# Altium footprint library PcbLib1.PcbLib: 102 footprints (part 4 of 7)
Each footprint in its own frame and in the unit in brackets; x right, y up, seen from the top. Pads: shape width x height; smd on the part's side, far side on the other; paste and mask are expansions set on the pad; w line width, h text height; cw(c..) or ccw(c..) is an arc to the next point about the centre after c.
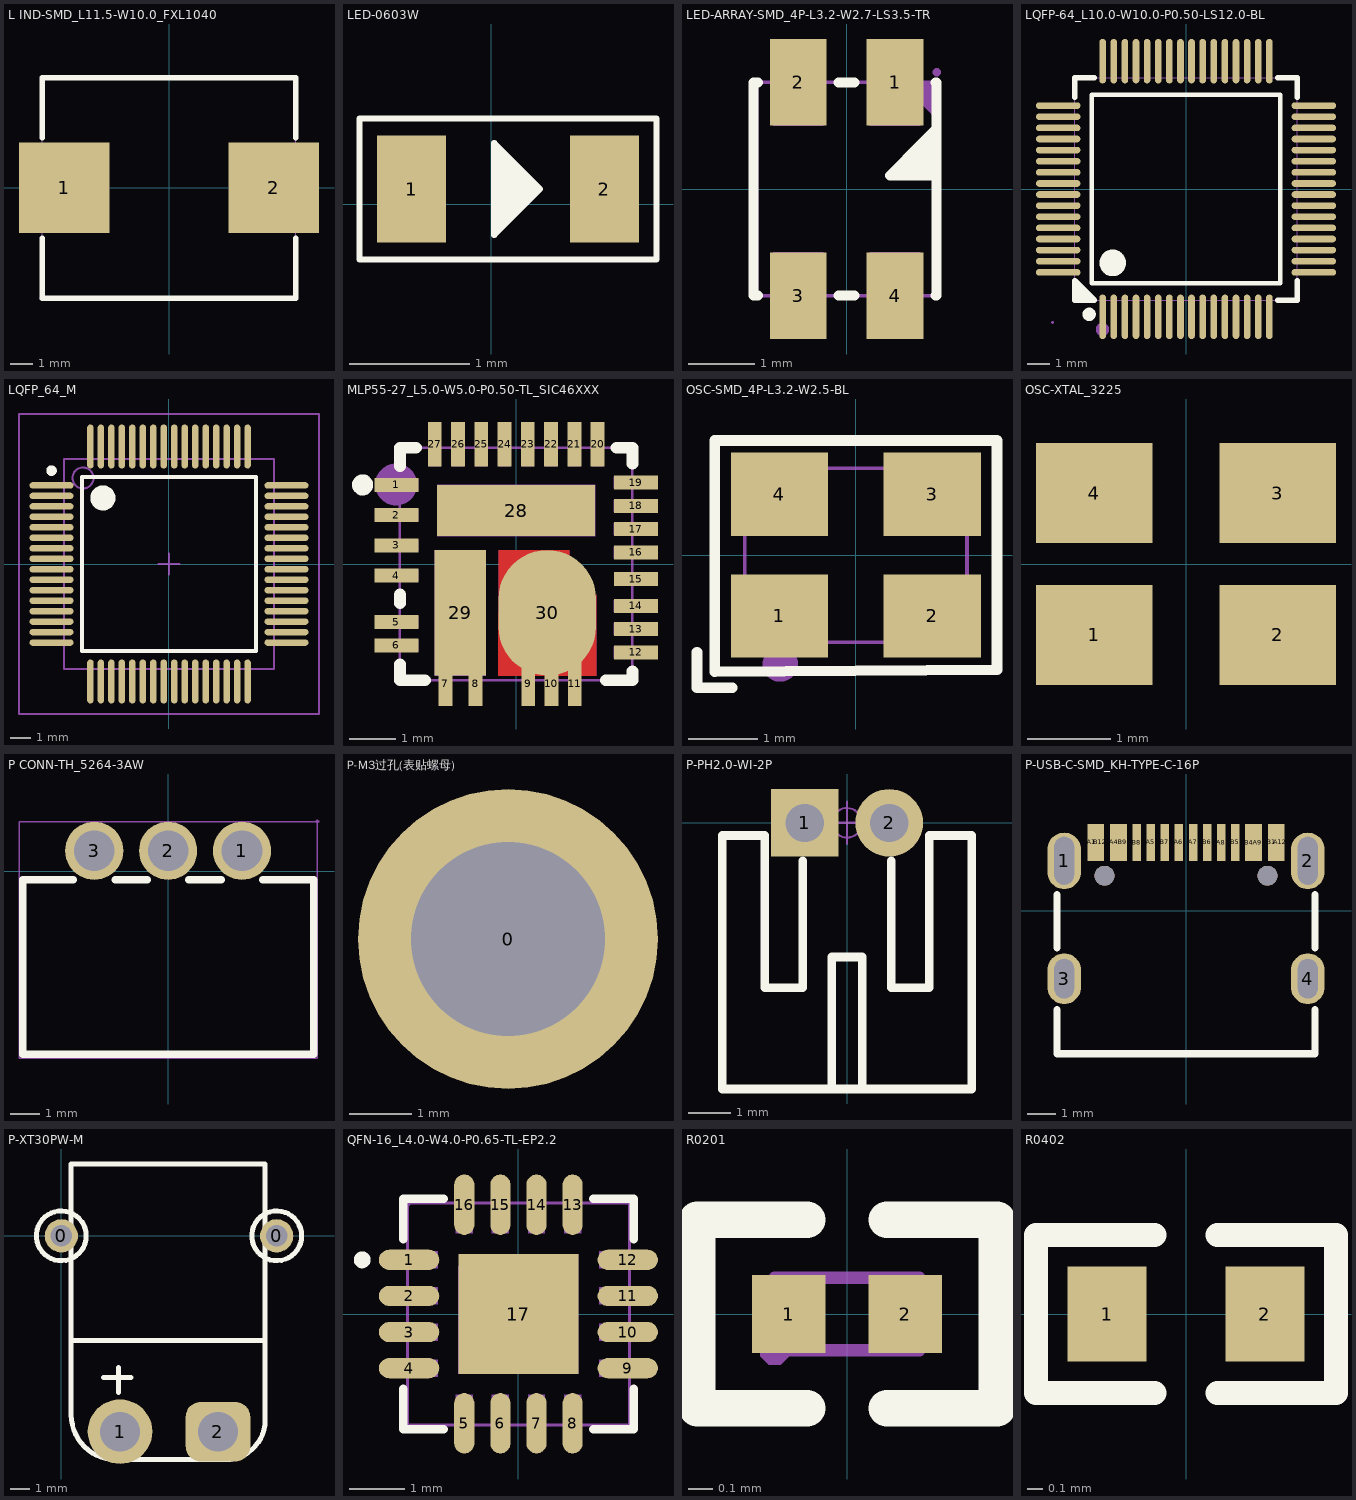
[diagram p3: the footprints below, top view; thin cyan lines are the x and y axes]

## L IND-SMD_L11.5-W10.0_FXL1040 [mm]
pads (2):
  rect 4.1x4.1 smd mask+0.051: 1(-4.75,0) 2(4.75,0)
Top Overlay:
  lines w0.254: -5.75,-2.281 -5.75,-5 5.75,-5 5.75,-2.281 ; -5.75,2.281 -5.75,5 5.75,5 5.75,2.281
Mechanical 15:
  region: -5.65,-5 -5.65,-4.959 -5.709,-4.9 -5.791,-4.9 -5.85,-4.959 -5.85,-5 -5.85,-5.041 -5.791,-5.1 -5.709,-5.1 -5.65,-5.041 -5.65,-5
  region: -5.75,-1.5 -5.75,1.5 -3.75,1.5 -3.75,-1.5
  region: 3.75,-1.5 3.75,1.5 5.75,1.5 5.75,-1.5
  lines w0.051: -5.75,-5 5.75,-5 5.75,5 -5.75,5 -5.75,-5

## LED-0603W [mil]
pads (2):
  rect 22.44x35 smd: 1(-26,5) 2(37,5)
Top Overlay:
  lines w2: 2,17 2,-7 3,-7 3,17 4,16 4,-5 5,-4 5,14 6,13 6,-4 8,-2 8,12 7,13 7,-2 9,0 9,11 10,10 10,1 12,3 ; 6,3 8,5 10,7 12,7 ; 12,3 12,6 12,5 15,5 14,6 13,5 13,3 13,6 12,7 ; 12,3 11,2 11,8 12,7 ; 12,3 12,7 ; -43,-18 54,-18 54,28 -43,28 -43,-18 ; 1,-10 1,20 16,5 1,-10
3D body "15.STEP": height 23.82, standoff -0.04, extent -25.5,-10 37.5,21.58

## LED-ARRAY-SMD_4P-L3.2-W2.7-LS3.5-TR [mm]
pads (4):
  rect 0.85x1.3 smd mask+0.05: 1(0.725,1.6) 2(-0.725,1.6) 3(-0.725,-1.6) 4(0.725,-1.6)
Top Overlay:
  region: 1.341,0.903 1.341,0.203 0.641,0.203
  lines w0.152: -1.33,-1.6 -1.4,-1.6 -1.4,1.6 -1.33,1.6 ; -0.12,-1.6 0.12,-1.6 ; -0.12,1.6 0.12,1.6 ; 1.33,-1.6 1.35,-1.6 1.35,1.6 1.33,1.6 ; 1.35,0.2 0.65,0.2 0.65,0.204 1.131,0.684 1.342,0.896 1.35,0.896
Mechanical 6:
  region: 1.075,-1.45 0.425,-1.45 0.425,-1.35 1.075,-1.35
  region: 0.7,-1.725 0.7,-1.075 0.8,-1.075 0.8,-1.725
  region: -0.85,0.975 -0.85,1.625 -0.75,1.625 -0.75,0.975
  region: -0.8,-1.625 -0.8,-0.975 -0.7,-0.975 -0.7,-1.625
  region: 0.5,1 0.5,1.65 0.6,1.65 0.6,1
  region: 1.35,1.6 0.8,1.6 1.35,1.05
Mechanical 15:
  region: -1.1,-1.75 -1.1,-0.95 -0.35,-0.95 -0.35,-1.75
  region: -1.1,0.95 -1.1,1.75 -0.35,1.75 -0.35,0.95
  region: 0.35,0.95 0.35,1.75 1.1,1.75 1.1,0.95
  region: 0.35,-1.75 0.35,-0.95 1.1,-0.95 1.1,-1.75
  region: 1.41,1.75 1.41,1.775 1.375,1.81 1.325,1.81 1.29,1.775 1.29,1.75 1.29,1.725 1.325,1.69 1.375,1.69 1.41,1.725 1.41,1.75
  lines w0.051: -1.35,-1.6 -1.35,1.6 1.35,1.6 1.35,-1.6 -1.35,-1.6
3D body "CASE-B-3528.STEP": height 1.97, standoff -0.03, extent -1.4,-1.85 1.4,1.85

## LQFP-64_L10.0-W10.0-P0.50-LS12.0-BL [mm]
pads (64):
  oval 0.3x2 smd: 1(-3.75,-5.75) 2(-3.25,-5.75) 3(-2.75,-5.75) 4(-2.25,-5.75) 5(-1.75,-5.75) 6(-1.25,-5.75) 7(-0.75,-5.75) 8(-0.25,-5.75) 9(0.25,-5.75) 10(0.75,-5.75) 11(1.25,-5.75) 12(1.75,-5.75) 13(2.25,-5.75) 14(2.75,-5.75) 15(3.25,-5.75) 16(3.75,-5.75) 33(3.75,5.75) 34(3.25,5.75) 35(2.75,5.75) 36(2.25,5.75) 37(1.75,5.75) 38(1.25,5.75) 39(0.75,5.75) 40(0.25,5.75) 41(-0.25,5.75) 42(-0.75,5.75) 43(-1.25,5.75) 44(-1.75,5.75) 45(-2.25,5.75) 46(-2.75,5.75) 47(-3.25,5.75) 48(-3.75,5.75)
  oval 2x0.3 smd: 17(5.75,-3.75) 18(5.75,-3.25) 19(5.75,-2.75) 20(5.75,-2.25) 21(5.75,-1.75) 22(5.75,-1.25) 23(5.75,-0.75) 24(5.75,-0.25) 25(5.75,0.25) 26(5.75,0.75) 27(5.75,1.25) 28(5.75,1.75) 29(5.75,2.25) 30(5.75,2.75) 31(5.75,3.25) 32(5.75,3.75) 49(-5.75,3.75) 50(-5.75,3.25) 51(-5.75,2.75) 52(-5.75,2.25) 53(-5.75,1.75) 54(-5.75,1.25) 55(-5.75,0.75) 56(-5.75,0.25) 57(-5.75,-0.25) 58(-5.75,-0.75) 59(-5.75,-1.25) 60(-5.75,-1.75) 61(-5.75,-2.25) 62(-5.75,-2.75) 63(-5.75,-3.25) 64(-5.75,-3.75)
Top Overlay:
  region: -4.131,-5 -5,-4.131 -5,-5
  lines w0.2: -4.25,-4.25 4.25,-4.25 4.25,4.25 -4.25,4.25 -4.25,-4.25
  lines w0.254: -5,4.131 -5,5 -4.131,5 ; 4.131,-5 5,-5 5,-4.131 ; 4.131,5 5,5 5,4.131 ; -5,-4.131 -5,-5 -4.131,-5 -5,-4.131 ; -5,-4.131 -5,-4.131
  lines w0.3: -4.361,-5.49 ccw(c-4.36,-5.64) -4.359,-5.49
  lines w0.6: -3.299,-3.025 ccw(c-3.297,-3.325) -3.294,-3.025
Mechanical 6:
  circle w0.3: c-3.76,-6.32 r0.15
Mechanical 15:
  drawing of 133 lines, arcs and shapes, not listed
3D body "LQFP-64(10x10)214.STEP": height 1.45, standoff 0, extent -6.003,-6.003 6.003,6.003

## LQFP_64_M [mm] "Thin QFP, 64-Leads, Body 10x10mm, Pitch 0.5mm, IPC Low Density"
height 1.6
pads (64):
  oval 2.1x0.3 smd: 1(-5.6,3.75) 2(-5.6,3.25) 3(-5.6,2.75) 4(-5.6,2.25) 5(-5.6,1.75) 6(-5.6,1.25) 7(-5.6,0.75) 8(-5.6,0.25) 9(-5.6,-0.25) 10(-5.6,-0.75) 11(-5.6,-1.25) 12(-5.6,-1.75) 13(-5.6,-2.25) 14(-5.6,-2.75) 15(-5.6,-3.25) 16(-5.6,-3.75) 33(5.6,-3.75) 34(5.6,-3.25) 35(5.6,-2.75) 36(5.6,-2.25) 37(5.6,-1.75) 38(5.6,-1.25) 39(5.6,-0.75) 40(5.6,-0.25) 41(5.6,0.25) 42(5.6,0.75) 43(5.6,1.25) 44(5.6,1.75) 45(5.6,2.25) 46(5.6,2.75) 47(5.6,3.25) 48(5.6,3.75)
  oval 0.3x2.1 smd: 17(-3.75,-5.6) 18(-3.25,-5.6) 19(-2.75,-5.6) 20(-2.25,-5.6) 21(-1.75,-5.6) 22(-1.25,-5.6) 23(-0.75,-5.6) 24(-0.25,-5.6) 25(0.25,-5.6) 26(0.75,-5.6) 27(1.25,-5.6) 28(1.75,-5.6) 29(2.25,-5.6) 30(2.75,-5.6) 31(3.25,-5.6) 32(3.75,-5.6) 49(3.75,5.6) 50(3.25,5.6) 51(2.75,5.6) 52(2.25,5.6) 53(1.75,5.6) 54(1.25,5.6) 55(0.75,5.6) 56(0.25,5.6) 57(-0.25,5.6) 58(-0.75,5.6) 59(-1.25,5.6) 60(-1.75,5.6) 61(-2.25,5.6) 62(-2.75,5.6) 63(-3.25,5.6) 64(-3.75,5.6)
Top Overlay:
  circle w0.6: c-3.15,3.15 r0.3
  circle w0.25: c-5.6,4.45 r0.125
  lines w0.2: -4.15,-4.15 4.15,-4.15 4.15,4.15 -4.15,4.15 -4.15,-4.15
Mechanical 13:
  circle w0.1: c-4.1,4.1 r0.5
  lines w0.1: -5,-5 5,-5 5,5 -5,5 -5,-5
Mechanical 15:
  lines w0.1: -0.5,0 0.5,0 ; 0,-0.5 0,0.5 ; -7.15,-7.15 7.15,-7.15 7.15,7.15 -7.15,7.15 -7.15,-7.15
3D body "User Library-STM32Fxxx -LQFP64 10mm x 10mm.STEP": height 1.6, standoff 0.01, extent -5.969,-6.029 6.029,5.969

## MLP55-27_L5.0-W5.0-P0.50-TL_SIC46XXX [mm]
pads (30):
  rect 0.95x0.3 smd paste-100 mask+0.05: 1(-2.575,1.7) 2(-2.575,1.05) 3(-2.575,0.4) 4(-2.575,-0.25) 5(-2.575,-1.25) 6(-2.575,-1.75) 12(2.575,-1.9) 13(2.575,-1.4) 14(2.575,-0.9) 15(2.575,-0.325) 16(2.575,0.25) 17(2.575,0.75) 18(2.575,1.25) 19(2.575,1.75)
  rect 0.3x0.95 smd paste-100 mask+0.05: 7(-1.52,-2.575) 8(-0.87,-2.575) 9(0.26,-2.575) 10(0.76,-2.575) 11(1.26,-2.575) 20(1.75,2.575) 21(1.25,2.575) 22(0.75,2.575) 23(0.25,2.575) 24(-0.25,2.575) 25(-0.75,2.575) 26(-1.25,2.575) 27(-1.75,2.575)
  rect 3.4x1.1 smd paste-100 mask+0.05: 28(0,1.15)
  rect 1.1x2.7 smd paste-100 mask+0.05: 29(-1.2,-1.05)
  oval 2.1x2.7 smd: 30(0.67,-1.05)
Top Layer:
  region: -0.37,0.3 1.14,0.3 1.14,-0.55 1.25,-0.66 1.72,-0.66 1.72,-2.4 -0.38,-2.4
Top Overlay:
  circle w0.254: c-3.3,1.7 r0.1
  lines w0.254: -2.5,-2.156 -2.5,-2.5 -1.958,-2.5 ; -2.5,-0.844 -2.5,-0.656 ; -2.5,2.106 -2.5,2.5 -2.156,2.5 ; 1.928,-2.5 2.5,-2.5 2.5,-2.306 ; 2.156,2.5 2.5,2.5 2.5,2.156
Top Paste:
  region: 3.05,-2.05 3.05,-1.75 2.1,-1.75 2.1,-2.05
  region: -3.05,-1.6 -3.05,-1.9 -2.1,-1.9 -2.1,-1.6
  region: 3.05,-1.55 3.05,-1.25 2.1,-1.25 2.1,-1.55
  region: -2.1,-1.4 -2.1,-1.1 -3.05,-1.1 -3.05,-1.4
  region: 3.05,-1.05 3.05,-0.75 2.1,-0.75 2.1,-1.05
  region: -3.05,-0.1 -3.05,-0.4 -2.1,-0.4 -2.1,-0.1
  region: -0.65,-2.4 -0.65,0.3 -1.75,0.3 -1.75,-2.4 -1.67,-2.4 -1.67,-3.05 -1.37,-3.05 -1.37,-2.4 -1.02,-2.4 -1.02,-3.05 -0.72,-3.05 -0.72,-2.4
  region: -0.37,0.3 -0.38,-2.4 0.11,-2.4 0.11,-3.05 0.41,-3.05 0.41,-2.4 0.61,-2.4 0.61,-3.05 0.91,-3.05 0.91,-2.4 1.11,-2.4 1.11,-3.05 1.41,-3.05 1.41,-2.4 1.72,-2.4 1.72,-0.66 1.25,-0.66 1.14,-0.55 1.14,0.3
  region: 2.1,0.4 2.1,0.1 3.05,0.1 3.05,0.4
  region: -3.05,0.55 -3.05,0.25 -2.1,0.25 -2.1,0.55
  region: 3.05,0.6 3.05,0.9 2.1,0.9 2.1,0.6
  region: -3.05,1.2 -3.05,0.9 -2.1,0.9 -2.1,1.2
  region: 3.05,1.1 3.05,1.4 2.1,1.4 2.1,1.1
  region: -1.7,1.7 -1.7,0.6 1.7,0.6 1.7,1.7
  region: -3.05,1.85 -3.05,1.55 -2.1,1.55 -2.1,1.85
  region: 3.05,1.6 3.05,1.9 2.1,1.9 2.1,1.6
  region: 1.1,3.05 1.1,2.1 1.4,2.1 1.4,3.05
  region: 0.9,2.1 0.9,3.05 0.6,3.05 0.6,2.1
  region: 0.4,2.1 0.4,3.05 0.1,3.05 0.1,2.1
  region: -0.1,2.1 -0.1,3.05 -0.4,3.05 -0.4,2.1
  region: -0.9,3.05 -0.9,2.1 -0.6,2.1 -0.6,3.05
  region: 1.6,3.05 1.6,2.1 1.9,2.1 1.9,3.05
  region: -1.4,3.05 -1.4,2.1 -1.1,2.1 -1.1,3.05
  region: -1.6,2.1 -1.6,3.05 -1.9,3.05 -1.9,2.1
Mechanical 6:
  circle w0.45: c-2.58,1.71 r0.225
Mechanical 15:
  drawing of 34 lines, arcs and shapes, not listed
3D body "MLP55-27L(5x5)214.STEP": height 0.75, standoff -0.01, extent -2.51,-2.51 2.51,2.51

## OSC-SMD_4P-L3.2-W2.5-BL [mm]
pads (4):
  rect 1.4x1.2 smd: 1(-1.1,-0.875) 2(1.1,-0.875) 3(1.1,0.875) 4(-1.1,0.875)
Top Overlay:
  lines w0.152: -2.286,-1.397 -2.286,-1.905 -1.778,-1.905 ; -2.029,-1.679 2.032,-1.651 2.032,0 2.032,1.651 -2.029,1.651 -2.029,-1.679
Mechanical 6:
  circle w0.254: c-1.088,-1.567 r0.127
  region: -1.738,-0.536 -1.702,-0.536 -1.702,-0.608 -1.738,-0.608
  region: -1.702,-0.536 -1.666,-0.536 -1.666,-0.608 -1.702,-0.608
  region: -1.666,-0.5 -1.63,-0.5 -1.63,-0.608 -1.666,-0.608
  region: -1.63,-0.464 -1.594,-0.464 -1.594,-0.572 -1.63,-0.572
  region: -1.594,-0.464 -1.558,-0.464 -1.558,-1.004 -1.594,-1.004
  region: -1.558,-0.428 -1.522,-0.428 -1.522,-1.004 -1.558,-1.004
  region: -1.522,-0.428 -1.486,-0.428 -1.486,-1.004 -1.522,-1.004
  region: -1.486,-0.428 -1.45,-0.428 -1.45,-1.004 -1.486,-1.004
Mechanical 15:
  region: 0.6,-0.449 1.5,-0.449 1.5,-1.249 0.6,-1.249
  region: -1.5,-0.449 -0.6,-0.449 -0.6,-1.249 -1.5,-1.249
  region: -1.5,1.249 -0.6,1.249 -0.6,0.449 -1.5,0.449
  region: 0.6,1.249 1.5,1.249 1.5,0.449 0.6,0.449
  region: -1.54,-1.25 -1.54,-1.225 -1.575,-1.19 -1.625,-1.19 -1.66,-1.225 -1.66,-1.25 -1.66,-1.275 -1.625,-1.31 -1.575,-1.31 -1.54,-1.275 -1.54,-1.25
  lines w0.051: -1.6,-1.25 1.6,-1.25 1.6,1.25 -1.6,1.25 -1.6,-1.25
3D body "SMD3225-4P214.STEP": height 0.8, standoff -0.01, extent -1.6,-1.25 1.6,1.25

## OSC-XTAL_3225 [mm]
pads (4):
  rect 1.4x1.2 smd: 1(-1.1,-0.85) 2(1.1,-0.85) 3(1.1,0.85) 4(-1.1,0.85)
3D body "SMD3225-4P214.STEP": height 0.8, standoff -0.01, extent -1.6,-1.25 1.6,1.25

## P CONN-TH_5264-3AW [mm]
pads (3):
  round 2 hole 1.4 mask+0.051: 1(2.54,0.7) 2(0,0.7) 3(-2.54,0.7)
Top Overlay:
  lines w0.254: -3.256,-0.3 -5,-0.3 -5,-6.3 5,-6.3 ; -1.824,-0.3 -0.716,-0.3 ; 0.716,-0.3 1.824,-0.3 ; 3.256,-0.3 5,-0.3 ; 5.001,-6.301 5.001,-2.829 5.001,-0.301
Mechanical 15:
  region: 3.14,0.7 3.14,0.819 3.049,1.04 2.88,1.209 2.659,1.3 2.421,1.3 2.2,1.209 2.031,1.04 1.94,0.819 1.94,0.7 1.94,0.581 2.031,0.36 2.2,0.191 2.421,0.1 2.659,0.1 2.88,0.191 3.049,0.36 3.14,0.581 3.14,0.7
  region: 0.6,0.7 0.6,0.819 0.509,1.04 0.34,1.209 0.119,1.3 -0.119,1.3 -0.34,1.209 -0.509,1.04 -0.6,0.819 -0.6,0.7 -0.6,0.581 -0.509,0.36 -0.34,0.191 -0.119,0.1 0.119,0.1 0.34,0.191 0.509,0.36 0.6,0.581 0.6,0.7
  region: -1.94,0.7 -1.94,0.819 -2.031,1.04 -2.2,1.209 -2.421,1.3 -2.659,1.3 -2.88,1.209 -3.049,1.04 -3.14,0.819 -3.14,0.7 -3.14,0.581 -3.049,0.36 -2.88,0.191 -2.659,0.1 -2.421,0.1 -2.2,0.191 -2.031,0.36 -1.94,0.581 -1.94,0.7
  region: 5.188,1.7 5.188,1.725 5.153,1.76 5.103,1.76 5.068,1.725 5.068,1.7 5.068,1.675 5.103,1.64 5.153,1.64 5.188,1.675 5.188,1.7
  lines w0.051: -5.127,-6.428 5.128,-6.428 5.128,1.7 -5.127,1.7 -5.127,-6.428

## P-M3过孔(表贴螺母) [mm]
pads (1):
  round 4.842 hole 3.13: 0(-60.125,-18.046)

## P-PH2.0-WI-2P [mm] "长：5.9mm，宽：6mm，高：4.7mm"
height 10
pads (2):
  rect 1.6x1.6 hole 0.9: 1(-1,0)
  round 1.6 hole 0.9: 2(1,0)
Top Overlay:
  lines w0.203: -1.05,-0.9 -1.05,-3.9 -1.95,-3.9 -1.95,-3.3 -1.95,-0.3 -2,-0.3 -2.95,-0.3 -2.95,-6.3 2.95,-6.3 2.95,-0.3 2,-0.3 1.95,-0.3 1.95,-3.3 1.95,-3.9 1.05,-3.9 1.05,-0.9 ; -0.365,-6.215 -0.365,-3.175 0.365,-3.175 0.365,-6.215
Mechanical 15:
  circle w0.05: c0,0 r0.35
  lines w0.05: -0.5,0 0.5,0 ; 0,-0.5 0,0.5
3D body "PH2.0-WI-2P.STEP": height 4.75, standoff -2.65, extent -2.95,-6.3 2.95,0.3

## P-USB-C-SMD_KH-TYPE-C-16P [mm] "C709357"
pads (22):
  oval 1.2x2 hole 0.7 slot 1.7 at 90 deg: 1(-4.32,1.765) 2(4.32,1.765)
  oval 1.2x1.8 hole 0.7 slot 1.4 at 90 deg: 3(-4.32,-2.415) 4(4.32,-2.415)
  rect 0.3x1.3 smd: A1(-3.35,2.415) A4(-2.55,2.415) A5(-1.25,2.415) A6(-0.25,2.415) A7(0.25,2.415) A8(1.25,2.415) A9(2.55,2.415) A12(3.35,2.415) B1(3.05,2.415) B4(2.25,2.415) B5(1.75,2.415) B6(0.75,2.415) B7(-0.75,2.415) B8(-1.75,2.415) B9(-2.25,2.415) B12(-3.05,2.415)
  round 0.7 hole 0.7 unplated: ""(-2.89,1.235) ""(2.89,1.235)
Top Overlay:
  lines w0.254: -4.572,-3.507 -4.572,-5.08 4.572,-5.08 4.572,-3.507 ; -4.572,-1.323 -4.572,0.573 ; 4.572,-1.323 4.572,0.573
Top Paste:
  region: -3.45,3.01 -2.95,3.01 -2.95,1.82 -3.45,1.82
  region: 2.95,3.01 3.45,3.01 3.45,1.82 2.95,1.82
  region: 2.15,3.01 2.65,3.01 2.65,1.82 2.15,1.82
  region: -2.65,3.01 -2.15,3.01 -2.15,1.82 -2.65,1.82
  region: 1.6,3.06 1.9,3.06 1.9,1.77 1.6,1.77
  region: 0.1,3.06 0.4,3.06 0.4,1.77 0.1,1.77
  region: -0.4,3.06 -0.1,3.06 -0.1,1.77 -0.4,1.77
  region: -0.9,3.06 -0.6,3.06 -0.6,1.77 -0.9,1.77
  region: -1.9,3.06 -1.6,3.06 -1.6,1.77 -1.9,1.77
  region: 0.6,3.06 0.9,3.06 0.9,1.77 0.6,1.77
  region: 1.1,3.06 1.4,3.06 1.4,1.77 1.1,1.77
  region: -4.92,2.165 -4.92,2.284 -4.828,2.505 -4.66,2.674 -4.439,2.765 -4.2,2.765 -3.98,2.674 -3.811,2.505 -3.72,2.284 -3.72,2.165 -3.72,1.365 -3.72,1.245 -3.811,1.025 -3.98,0.856 -4.2,0.765 -4.439,0.765 -4.66,0.856 -4.828,1.025 -4.92,1.245 -4.92,1.365
  region: -4.92,-2.115 -4.92,-1.996 -4.828,-1.775 -4.66,-1.607 -4.439,-1.515 -4.2,-1.515 -3.98,-1.607 -3.811,-1.775 -3.72,-1.996 -3.72,-2.115 -3.72,-2.715 -3.72,-2.835 -3.811,-3.055 -3.98,-3.224 -4.2,-3.315 -4.439,-3.315 -4.66,-3.224 -4.828,-3.055 -4.92,-2.835 -4.92,-2.715
  region: 3.72,2.165 3.722,2.283 3.814,2.502 3.983,2.668 4.202,2.758 4.439,2.758 4.658,2.668 4.826,2.502 4.919,2.283 4.92,2.165 4.92,1.365 4.919,1.246 4.826,1.028 4.658,0.862 4.439,0.772 4.202,0.772 3.983,0.862 3.814,1.028 3.722,1.246 3.72,1.365
  region: 3.72,-2.115 3.722,-1.997 3.814,-1.779 3.983,-1.612 4.202,-1.522 4.439,-1.522 4.658,-1.612 4.826,-1.779 4.919,-1.997 4.92,-2.115 4.92,-2.715 4.919,-2.834 4.826,-3.052 4.658,-3.218 4.439,-3.309 4.202,-3.309 3.983,-3.218 3.814,-3.052 3.722,-2.834 3.72,-2.715
  region: -1.4,3.06 -1.1,3.06 -1.1,1.77 -1.4,1.77
Mechanical 15:
  circle w0.25: c-2.89,1.235 r0.125
  circle w0.25: c2.89,1.235 r0.125

## P-XT30PW-M [mm] "连接器"
pads (4):
  round 1.7 hole 1.1: 0(0,0) 0(11,0)
  round 3.302 hole 2.032: 1(3,-10)
  rrect50% 3.302x3.048 hole 2.032: 2(8,-10)
Top Overlay:
  circle w0.254: c11,0 r1.272
  circle w0.254: c0,0 r1.272
  lines w0.254: 2.159,-7.239 3.556,-7.239 ; 2.667,-11.43 8.382,-11.43 ccw(c8.382,-9.399) 10.413,-9.399 ; 2.794,-11.43 cw(c2.794,-9.144) 0.508,-9.144 0.508,-5.334 ; 2.921,-8.001 2.921,-6.731 ; 10.408,-9.399 10.408,-5.334 ; 0.508,-5.334 0.508,3.666 10.408,3.666 10.408,2.915 10.408,-5.334 ; 0.508,-5.334 10.408,-5.334
3D body "User Library-XT30- curved.STEP": height 5, standoff -2.1, extent -1.189,-11.295 12.111,3.711

## QFN-16_L4.0-W4.0-P0.65-TL-EP2.2 [mil]
pads (17):
  oval 42.8x14.33 smd: 1(-77.5,38.39) 2(-77.5,12.79) 3(-77.5,-12.8) 4(-77.5,-38.39) 9(77.5,-38.39) 10(77.5,-12.8) 11(77.5,12.79) 12(77.5,38.39)
  oval 14.33x42.8 smd: 5(-38.39,-77.5) 6(-12.79,-77.5) 7(12.8,-77.5) 8(38.39,-77.5) 13(38.39,77.5) 14(12.8,77.5) 15(-12.79,77.5) 16(-38.39,77.5)
  rect 85.04x85.04 smd: 17(0,0)
Top Overlay:
  circle w6: c-110.71,38.39 r3
  lines w6: -81.74,-53.05 -81.74,-81.74 -53.05,-81.74 ; -81.74,53.05 -81.74,81.74 -53.05,81.74 ; 53.05,-81.74 81.74,-81.74 81.74,-53.05 ; 53.05,81.74 81.74,81.74 81.74,53.05
Mechanical 6:
  circle w6: c-90.55,38.39 r3
Mechanical 15:
  region: -34.02,42.52 42.52,42.52 42.52,-42.52 -42.52,-42.52 -42.52,34.02
  region: -44.39,57.09 -32.38,57.09 -32.38,78.74 -44.39,78.74
  region: -18.8,57.09 -6.79,57.09 -6.79,78.74 -18.8,78.74
  region: 6.79,57.09 18.8,57.09 18.8,78.74 6.79,78.74
  region: 32.38,57.09 44.39,57.09 44.39,78.74 32.38,78.74
  region: 78.74,44.39 57.09,44.39 57.09,32.38 78.74,32.38
  region: 78.74,18.8 57.09,18.8 57.09,6.79 78.74,6.79
  region: 78.74,-6.79 57.09,-6.79 57.09,-18.8 78.74,-18.8
  region: 78.74,-32.38 57.09,-32.38 57.09,-44.39 78.74,-44.39
  region: 32.38,-57.09 44.39,-57.09 44.39,-78.74 32.38,-78.74
  region: 6.79,-57.09 18.8,-57.09 18.8,-78.74 6.79,-78.74
  region: -18.8,-57.09 -6.79,-57.09 -6.79,-78.74 -18.8,-78.74
  region: -44.39,-57.09 -32.38,-57.09 -32.38,-78.74 -44.39,-78.74
  region: -78.74,-32.38 -57.09,-32.38 -57.09,-44.39 -78.74,-44.39
  region: -78.74,-6.79 -57.09,-6.79 -57.09,-18.8 -78.74,-18.8
  region: -78.74,18.8 -57.09,18.8 -57.09,6.79 -78.74,6.79
  region: -78.74,44.39 -57.09,44.39 -57.09,32.38 -78.74,32.38
  region: -76.38,78.74 -76.38,79.72 -77.76,81.1 -79.72,81.1 -81.1,79.72 -81.1,78.74 -81.1,77.76 -79.72,76.38 -77.76,76.38 -76.38,77.76 -76.38,78.74
  lines w2: -78.74,-78.74 -78.74,78.74 78.74,78.74 78.74,-78.74 -78.74,-78.74
3D body "QFN-16-EP(4x4)214.STEP": height 40.94, standoff 0.39, extent -79.13,-79.13 79.13,79.13

## R0201 [mm]
pads (2):
  rect 0.303x0.324 smd paste-100 mask+0.051: 1(-0.242,0) 2(0.242,0)
Top Overlay:
  lines w0.152: -0.166,-0.391 -0.622,-0.391 -0.622,0.391 -0.166,0.391 ; 0.166,-0.391 0.622,-0.391 0.622,0.391 0.166,0.391
Top Paste:
  region: -0.081,-0.138 -0.081,0.138 -0.105,0.162 -0.369,0.162 -0.393,0.138 -0.393,-0.138 -0.369,-0.162 -0.105,-0.162
  region: 0.081,-0.138 0.081,0.138 0.105,0.162 0.369,0.162 0.393,0.138 0.393,-0.138 0.369,-0.162 0.105,-0.162
Mechanical 15:
  region: -0.24,-0.15 -0.24,-0.125 -0.275,-0.09 -0.325,-0.09 -0.36,-0.125 -0.36,-0.15 -0.36,-0.175 -0.325,-0.21 -0.275,-0.21 -0.24,-0.175 -0.24,-0.15
  region: 0.3,-0.15 0.3,0.15 0.15,0.15 0.15,-0.15
  region: -0.3,-0.15 -0.3,0.15 -0.15,0.15 -0.15,-0.15
  lines w0.051: -0.3,-0.15 0.3,-0.15 0.3,0.15 -0.3,0.15 -0.3,-0.15
3D body "0201214.STEP": height 0.24, standoff 0, extent -0.3,-0.15 0.3,0.151

## R0402 [mm]
pads (2):
  rect 0.5x0.6 smd paste+0 mask+0.05: 1(-0.5,0) 2(0.5,0)
Top Overlay:
  lines w0.15: -0.2,-0.5 -0.95,-0.5 -0.95,0.5 -0.2,0.5 ; 0.2,-0.5 0.95,-0.5 0.95,0.5 0.2,0.5
3D body "0402.STEP": height 0.5, standoff 0, extent -0.5,-0.25 0.5,0.25